# Altium footprint library AUAV_X05.PcbLib: 69 footprints (part 2 of 5)
Each footprint in its own frame and in the unit in brackets; x right, y up, seen from the top. Pads: shape width x height; smd on the part's side, far side on the other; paste and mask are expansions set on the pad; w line width, h text height; cw(c..) or ccw(c..) is an arc to the next point about the centre after c.
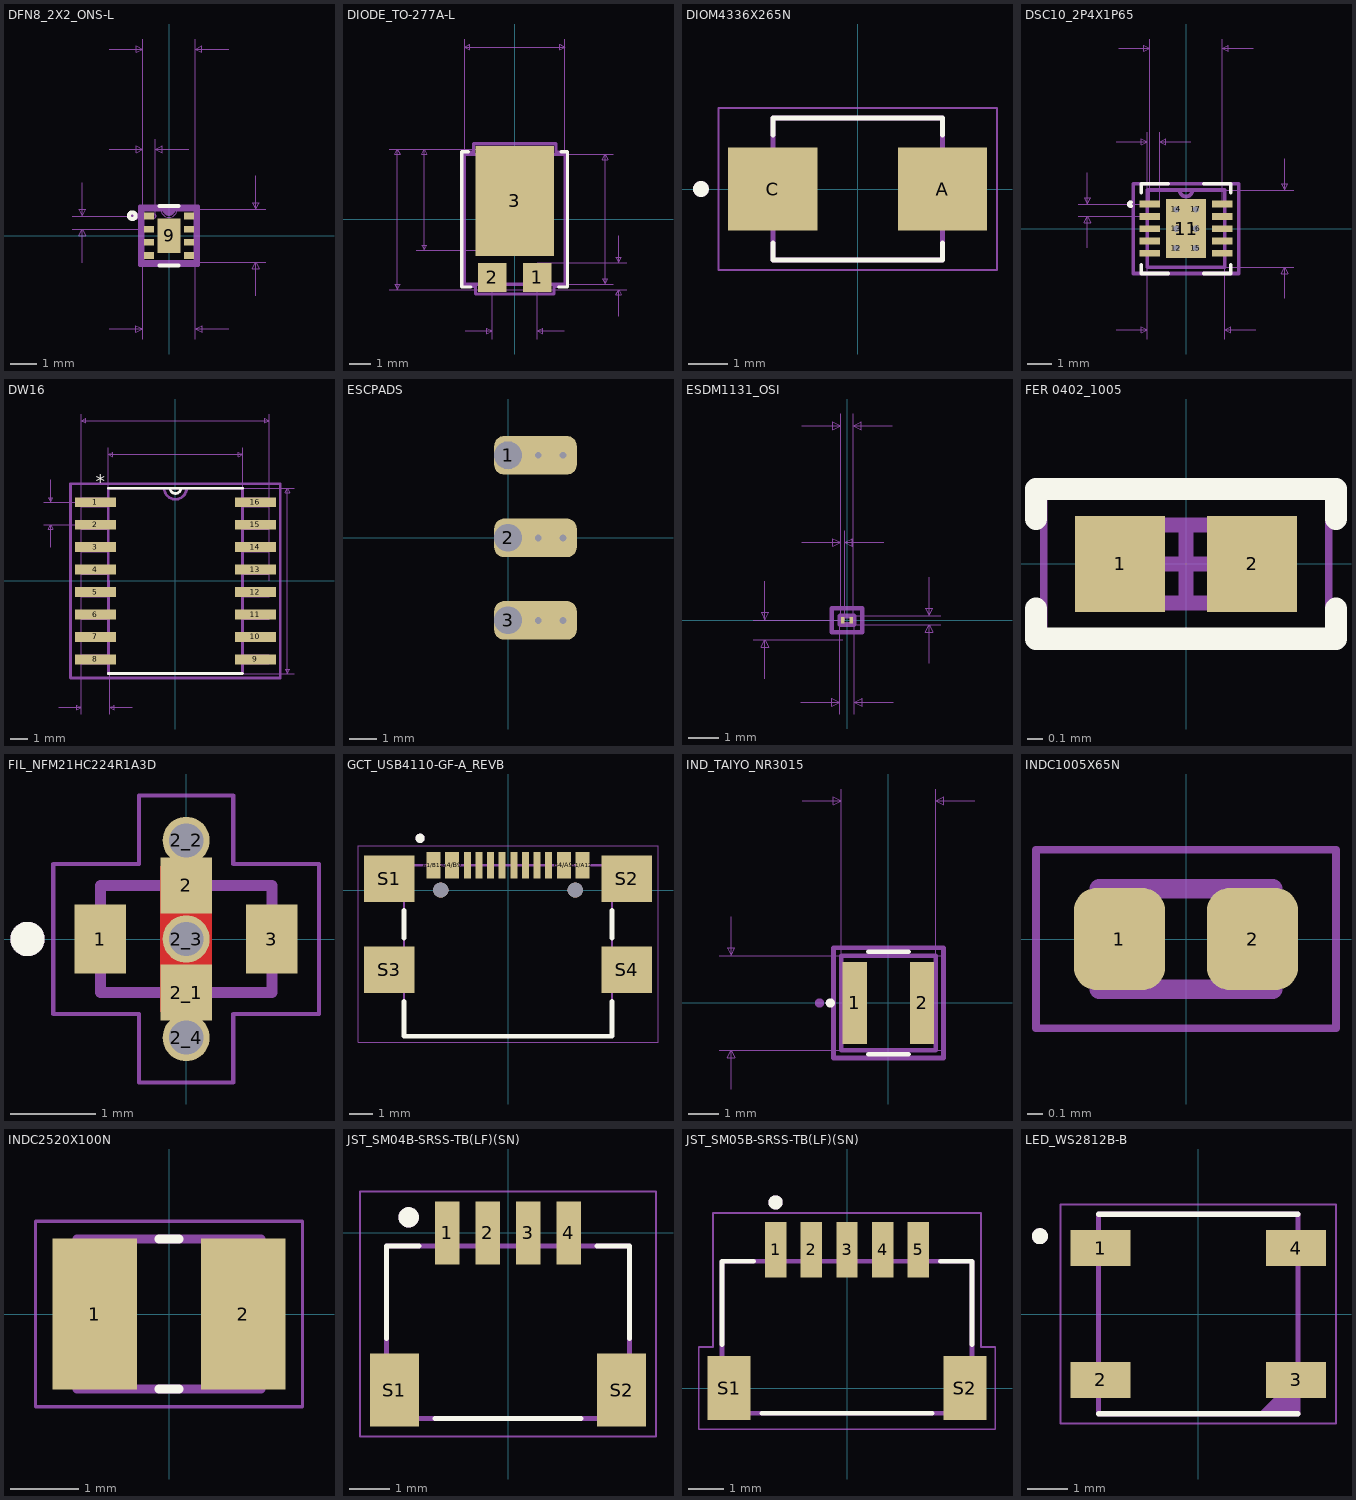
[diagram p1: the footprints below, top view; thin cyan lines are the x and y axes]

## DFN8_2X2_ONS-L [mil]
pads (9):
  rect 15x10 smd: 1(-29.87,29.53) 2(-29.87,9.84) 3(-29.87,-9.84) 4(-29.87,-29.53) 5(29.87,-29.53) 6(29.87,-9.84) 7(29.87,9.84) 8(29.87,29.53)
  rect 34x51 smd: 9(0,0)
Top Overlay:
  circle w6: c-55,30 r5
  lines w6: -13.88,-44.5 13.88,-44.5 ; -13.88,44.5 13.88,44.5
Mechanical 1:
  circle w1: c-22.37,29.53 r3
  lines w1: -12,39.5 ccw(c0,39.5) 12,39.5 ; -39.5,-39.5 39.5,-39.5 39.5,39.5 -39.5,39.5 -39.5,-39.5
Mechanical 16:
  circle w6: c-51.21,29.53 r3
  lines w1: -144.87,9.84 -29.87,9.84 ; -144.87,29.53 -29.87,29.53 ; -129.87,-40.16 -129.87,9.84 ; -129.87,79.53 -129.87,29.53 ; -89.5,-139.5 -39.5,-139.5 ; -89.37,129.53 -39.37,129.53 ; -89.37,279.53 -39.37,279.53 ; -39.5,-154.5 -39.5,-39.5 ; -39.37,144.53 -39.37,29.53 -39.37,294.53 ; -20.37,29.53 -20.37,144.53 ; 29.63,129.53 -20.37,129.53 ; 39.37,29.53 39.37,294.53 ; 39.5,-154.5 39.5,-39.5 144.87,-39.5 ; 39.5,39.5 144.87,39.5 ; 89.37,279.53 39.37,279.53 ; 89.5,-139.5 39.5,-139.5 ; 129.87,-89.5 129.87,-39.5 ; 129.87,89.5 129.87,39.5 ; -129.87,9.84 -134.87,-0.16 -124.87,-0.16 -129.87,9.84 ; -129.87,29.53 -134.87,39.53 -124.87,39.53 -129.87,29.53 ; -39.5,-139.5 -49.5,-134.5 -49.5,-144.5 -39.5,-139.5 ; -39.37,129.53 -49.37,134.53 -49.37,124.53 -39.37,129.53 ; -39.37,279.53 -49.37,284.53 -49.37,274.53 -39.37,279.53 ; -20.37,129.53 -10.37,134.53 -10.37,124.53 -20.37,129.53 ; 39.37,279.53 49.37,284.53 49.37,274.53 39.37,279.53 ; 39.5,-139.5 49.5,-134.5 49.5,-144.5 39.5,-139.5 ; 129.87,-39.5 124.87,-49.5 134.87,-49.5 129.87,-39.5 ; 129.87,39.5 124.87,49.5 134.87,49.5 129.87,39.5
  lines w6: -6.58,39.5 ccw(c0,39.5) 6.58,39.5 ; -43.5,-43.5 -43.5,-38.53 -43.5,38.53 -43.5,43.5 43.5,43.5 43.5,38.53 43.5,-38.53 43.5,-43.5 -43.5,-43.5 ; -39.5,-39.5 -39.5,39.5 39.5,39.5 39.5,-39.5 -39.5,-39.5
  text "Default Padstyle: RX15Y10D0T" at 0,-359.5 h31.25
  text "Heat Tab Padstyle: RX34Y51D0T" at 0,-419.5 h31.25
  text "Alt 1 Padstyle: OX60Y90D30P" at 0,-539.5 h31.25
  text "Alt 2 Padstyle: OX90Y60D30P" at 0,-599.5 h31.25
  text "0.079in/2mm" at 0,299.53 h15.62
  text "0.019in/0.483mm" at -29.87,149.53 h15.62
  text "0.02in/0.5mm" at -149.87,19.68 h15.62
  text "0.079in/2.007mm" at 149.87,0 h15.62
  text "0.079in/2.007mm" at 0,-159.5 h15.62
3D body "DFN8_2X2_ONS.step": height 39.09, standoff 0, extent -39.49,-39.49 39.49,39.49

## DIODE_TO-277A-L [mil]
pads (3):
  rect 53x54 smd: 1(42,-108) 2(-42,-108)
  rect 146x205 smd: 3(0,34.5)
Top Overlay:
  lines w6: -86.1,126 -98.5,126 -98.5,-126 -81.6,-126 ; 81.6,-126 98.5,-126 98.5,126 86.1,126
Mechanical 1:
  lines w1: -93.5,-121 93.5,-121 93.5,121 -93.5,121 -93.5,-121
Mechanical 16:
  lines w1: -233.5,-131 42,-131 208.5,-131 ; -233.5,131 42,131 -183.5,131 ; -183.5,-58 42,-58 ; -93.5,-121 -93.5,336 ; -92,-208 -42,-208 ; -42,-223 -42,-108 ; 42,-223 42,-108 ; 42,-81 208.5,-81 ; 92,-208 42,-208 ; 93.5,121 183.5,121 ; 93.5,336 93.5,-121 183.5,-121 ; 193.5,-181 193.5,-131 ; 193.5,-31 193.5,-81 ; -218.5,-131 -218.5,131 ; -218.5,-131 -223.5,-121 -213.5,-121 -218.5,-131 ; -218.5,131 -223.5,121 -213.5,121 -218.5,131 ; -168.5,-58 -168.5,131 ; -168.5,-58 -173.5,-48 -163.5,-48 -168.5,-58 ; -168.5,131 -173.5,121 -163.5,121 -168.5,131 ; -93.5,321 93.5,321 ; -93.5,321 -83.5,326 -83.5,316 -93.5,321 ; -42,-208 -52,-203 -52,-213 -42,-208 ; 42,-208 52,-203 52,-213 42,-208 ; 93.5,321 83.5,326 83.5,316 93.5,321 ; 168.5,-121 168.5,121 ; 168.5,-121 163.5,-111 173.5,-111 168.5,-121 ; 168.5,121 163.5,111 173.5,111 168.5,121 ; 193.5,-131 188.5,-141 198.5,-141 193.5,-131 ; 193.5,-81 188.5,-71 198.5,-71 193.5,-81
  lines w6: -97.5,-125 -97.5,125 -77,125 -77,141 77,141 77,125 97.5,125 97.5,-125 73,-125 73,-139 -73,-139 -73,-125 -97.5,-125 ; -93.5,-121 -93.5,121 93.5,121 93.5,-121 -93.5,-121
  text "Default Padstyle: RX54Y53D0T" at 0,-431 h31.25
  text "Alt 1 Padstyle: OX60Y90D30P" at 0,-491 h31.25
  text "Alt 2 Padstyle: OX90Y60D30P" at 0,-551 h31.25
  text "0.262in/6.655mm" at -238.5,0 h15.62
  text "0.05in/1.27mm" at 213.5,-106 h15.62
  text "0.084in/2.134mm" at 0,-228 h15.62
  text "0.242in/6.147mm" at 188.5,0 h15.62
  text "0.187in/4.75mm" at 0,341 h15.62
3D body "smpc package.step": height 41.34, standoff 0, extent -91.1,-130 90,125.9

## DIOM4336X265N [mm]
pads (2):
  rect 2.28x2.12 smd: A(2.165,0) C(-2.165,0)
Top Overlay:
  circle w0.2: c-4,0 r0.1
  lines w0.127: -2.163,-1.38 -2.163,-1.813 2.163,-1.813 2.163,-1.38 ; -2.163,1.38 -2.163,1.813 2.163,1.813 2.163,1.38
Top 3D Body:
  circle w0.2: c-4,0 r0.1
  lines w0.127: -2.163,-1.813 -2.163,1.813 2.163,1.813 2.163,-1.813 -2.163,-1.813
Mechanical 15:
  lines w0.05: -3.555,-2.063 -3.555,2.063 3.555,2.063 3.555,-2.063 -3.555,-2.063
3D body "step_temp.STEP": height 2.65, standoff 0, extent -2.675,-1.813 2.675,1.813

## DSC10_2P4X1P65 [mm]
pads (17):
  rect 0.85x0.28 smd: 1(-1.475,1) 2(-1.475,0.5) 3(-1.475,0) 4(-1.475,-0.5) 5(-1.475,-1) 6(1.475,-1) 7(1.475,-0.5) 8(1.475,0) 9(1.475,0.5) 10(1.475,1)
  rect 1.65x2.4 smd: 11(0,0)
  round 0.508 hole 0.254 mask-25.4: 12(-0.394,-0.787) 13(-0.394,0) 14(-0.394,0.787) 15(0.394,-0.787) 16(0.394,0) 17(0.394,0.787)
Top Overlay:
  lines w0.152: -2.233,0.926 cw(c-2.252,1) -2.233,1.074 ; -1.829,-1.473 -1.829,-1.829 -0.723,-1.829 ; -1.829,1.473 -1.829,1.829 -0.723,1.829 ; 0.723,-1.829 1.829,-1.829 1.829,-1.473 ; 0.723,1.829 1.829,1.829 1.829,1.473
Top Solder:
  region: -0.394,-0.528 -0.493,-0.548 -0.577,-0.604 -0.633,-0.688 -0.653,-0.787 -0.633,-0.887 -0.577,-0.971 -0.493,-1.027 -0.394,-1.046 -0.295,-1.027 -0.211,-0.971 -0.154,-0.887 -0.135,-0.787 -0.154,-0.688 -0.211,-0.604 -0.295,-0.548
  region: -0.394,0.259 -0.493,0.239 -0.577,0.183 -0.633,0.099 -0.653,0 -0.633,-0.099 -0.577,-0.183 -0.493,-0.239 -0.394,-0.259 -0.295,-0.239 -0.211,-0.183 -0.154,-0.099 -0.135,0 -0.154,0.099 -0.211,0.183 -0.295,0.239
  region: -0.394,1.046 -0.493,1.027 -0.577,0.971 -0.633,0.887 -0.653,0.787 -0.633,0.688 -0.577,0.604 -0.493,0.548 -0.394,0.528 -0.295,0.548 -0.211,0.604 -0.154,0.688 -0.135,0.787 -0.154,0.887 -0.211,0.971 -0.295,1.027
  region: 0.394,-0.528 0.295,-0.548 0.211,-0.604 0.154,-0.688 0.135,-0.787 0.154,-0.887 0.211,-0.971 0.295,-1.027 0.394,-1.046 0.493,-1.027 0.577,-0.971 0.633,-0.887 0.653,-0.787 0.633,-0.688 0.577,-0.604 0.493,-0.548
  region: 0.394,0.259 0.295,0.239 0.211,0.183 0.154,0.099 0.135,0 0.154,-0.099 0.211,-0.183 0.295,-0.239 0.394,-0.259 0.493,-0.239 0.577,-0.183 0.633,-0.099 0.653,0 0.633,0.099 0.577,0.183 0.493,0.239
  region: 0.394,1.046 0.295,1.027 0.211,0.971 0.154,0.887 0.135,0.787 0.154,0.688 0.211,0.604 0.295,0.548 0.394,0.528 0.493,0.548 0.577,0.604 0.633,0.688 0.653,0.787 0.633,0.887 0.577,0.971 0.493,1.027
Bottom Solder:
  region: -0.394,-0.528 -0.493,-0.548 -0.577,-0.604 -0.633,-0.688 -0.653,-0.787 -0.633,-0.887 -0.577,-0.971 -0.493,-1.027 -0.394,-1.046 -0.295,-1.027 -0.211,-0.971 -0.154,-0.887 -0.135,-0.787 -0.154,-0.688 -0.211,-0.604 -0.295,-0.548
  region: -0.394,0.259 -0.493,0.239 -0.577,0.183 -0.633,0.099 -0.653,0 -0.633,-0.099 -0.577,-0.183 -0.493,-0.239 -0.394,-0.259 -0.295,-0.239 -0.211,-0.183 -0.154,-0.099 -0.135,0 -0.154,0.099 -0.211,0.183 -0.295,0.239
  region: -0.394,1.046 -0.493,1.027 -0.577,0.971 -0.633,0.887 -0.653,0.787 -0.633,0.688 -0.577,0.604 -0.493,0.548 -0.394,0.528 -0.295,0.548 -0.211,0.604 -0.154,0.688 -0.135,0.787 -0.154,0.887 -0.211,0.971 -0.295,1.027
  region: 0.394,-0.528 0.295,-0.548 0.211,-0.604 0.154,-0.688 0.135,-0.787 0.154,-0.887 0.211,-0.971 0.295,-1.027 0.394,-1.046 0.493,-1.027 0.577,-0.971 0.633,-0.887 0.653,-0.787 0.633,-0.688 0.577,-0.604 0.493,-0.548
  region: 0.394,0.259 0.295,0.239 0.211,0.183 0.154,0.099 0.135,0 0.154,-0.099 0.211,-0.183 0.295,-0.239 0.394,-0.259 0.493,-0.239 0.577,-0.183 0.633,-0.099 0.653,0 0.633,0.099 0.577,0.183 0.493,0.239
  region: 0.394,1.046 0.295,1.027 0.211,0.971 0.154,0.887 0.135,0.787 0.154,0.688 0.211,0.604 0.295,0.548 0.394,0.528 0.493,0.548 0.577,0.604 0.633,0.688 0.653,0.787 0.633,0.887 0.577,0.971 0.493,1.027
Mechanical 1:
  circle w0.025: c-2.252,1 r0.076
  lines w0.025: -0.305,1.575 ccw(c0,1.575) 0.305,1.575 ; -1.575,-1.575 1.575,-1.575 1.575,1.575 -1.575,1.575 -1.575,-1.575
Mechanical 16:
  circle w0.152: c-2.252,1 r0.076
  lines w0.025: -4.396,0.5 -1.475,0.5 ; -4.396,1 -1.475,1 -1.475,7.731 ; -4.015,-0.77 -4.015,0.5 ; -4.015,2.27 -4.015,1 ; -2.845,-4.115 -1.575,-4.115 ; -2.845,3.54 -1.575,3.54 ; -2.745,7.35 -1.475,7.35 ; -1.575,-4.496 -1.575,-1.575 ; -1.575,1 -1.575,3.921 ; -1.075,1 -1.075,3.921 ; 0.195,3.54 -1.075,3.54 ; 1.475,1 1.475,7.731 ; 1.575,-4.496 1.575,-1.575 4.396,-1.575 ; 1.575,1.575 4.396,1.575 ; 2.745,7.35 1.475,7.35 ; 2.845,-4.115 1.575,-4.115 ; 4.015,-2.845 4.015,-1.575 ; 4.015,2.845 4.015,1.575 ; -4.015,0.5 -4.142,0.246 -3.888,0.246 -4.015,0.5 ; -4.015,1 -4.142,1.254 -3.888,1.254 -4.015,1 ; -1.575,-4.115 -1.829,-3.988 -1.829,-4.242 -1.575,-4.115 ; -1.575,3.54 -1.829,3.667 -1.829,3.413 -1.575,3.54 ; -1.475,7.35 -1.729,7.477 -1.729,7.223 -1.475,7.35 ; -1.075,3.54 -0.821,3.667 -0.821,3.413 -1.075,3.54 ; 1.475,7.35 1.729,7.477 1.729,7.223 1.475,7.35 ; 1.575,-4.115 1.829,-3.988 1.829,-4.242 1.575,-4.115 ; 4.015,-1.575 3.888,-1.829 4.142,-1.829 4.015,-1.575 ; 4.015,1.575 3.888,1.829 4.142,1.829 4.015,1.575
  lines w0.152: -0.262,1.575 ccw(c0,1.575) 0.262,1.575 ; -2.154,-1.829 -2.154,1.829 2.154,1.829 2.154,-1.829 -2.154,-1.829 ; -1.575,-1.575 -1.575,1.575 1.575,1.575 1.575,-1.575 -1.575,-1.575
  text "Default Padstyle: RX33p46Y11p02D0T" at 0,-9.83 h0.79
  text "Alt 1 Padstyle: OX60Y90D30P" at 0,-11.735 h0.79
  text "Alt 2 Padstyle: OX90Y60D30P" at 0,-13.64 h0.79
  text ".1161417in/2.95mm" at 0,7.858 h0.4
  text "1.968504E-02in/.5mm" at -1.325,4.048 h0.4
  text "1.968504E-02in/.5mm" at -4.523,0.75 h0.4
  text ".1240157in/3.15mm" at 4.523,0 h0.4
  text ".1240157in/3.15mm" at 0,-4.623 h0.4
3D body "DSC0010J.stp": height 0.8, standoff 0, extent -1.5,-1.5 1.5,1.5

## DW16 [mil]
pads (16):
  rect 91x22 smd: 1(-178,175) 2(-178,125) 3(-178,75) 4(-178,25) 5(-178,-25) 6(-178,-75) 7(-178,-125) 8(-178,-175) 9(178,-175) 10(178,-125) 11(178,-75) 12(178,-25) 13(178,25) 14(178,75) 15(178,125) 16(178,175)
Top Overlay:
  lines w6: -149.5,-206.5 149.5,-206.5 ; -149.5,206.5 149.5,206.5 ; -12,206.5 ccw(c0,206.5) 12,206.5
  text "*" at -177,204.61 h31.25
Mechanical 1:
  lines w1: -12,206.5 ccw(c0,206.5) 12,206.5 ; -209.5,-185 -209.5,-165 -149.5,-165 -149.5,-185 -209.5,-185 ; -209.5,-135 -209.5,-115 -149.5,-115 -149.5,-135 -209.5,-135 ; -209.5,-85 -209.5,-65 -149.5,-65 -149.5,-85 -209.5,-85 ; -209.5,-35 -209.5,-15 -149.5,-15 -149.5,-35 -209.5,-35 ; -209.5,15 -209.5,35 -149.5,35 -149.5,15 -209.5,15 ; -209.5,65 -209.5,85 -149.5,85 -149.5,65 -209.5,65 ; -209.5,115 -209.5,135 -149.5,135 -149.5,115 -209.5,115 ; -209.5,165 -209.5,185 -149.5,185 -149.5,165 -209.5,165 ; -149.5,-206.5 149.5,-206.5 149.5,206.5 -149.5,206.5 -149.5,-206.5 ; 149.5,-185 149.5,-165 209.5,-165 209.5,-185 149.5,-185 ; 149.5,-135 149.5,-115 209.5,-115 209.5,-135 149.5,-135 ; 149.5,-85 149.5,-65 209.5,-65 209.5,-85 149.5,-85 ; 149.5,-35 149.5,-15 209.5,-15 209.5,-35 149.5,-35 ; 149.5,15 149.5,35 209.5,35 209.5,15 149.5,15 ; 149.5,65 149.5,85 209.5,85 209.5,65 149.5,65 ; 149.5,115 149.5,135 209.5,135 209.5,115 149.5,115 ; 149.5,165 149.5,185 209.5,185 209.5,165 149.5,165
  text "*" at -177,204.61 h31.25
Mechanical 16:
  lines w1: -293,125 -178,125 ; -293,175 -178,175 ; -278,75 -278,125 ; -278,225 -278,175 ; -259.5,-281.5 -209.5,-281.5 ; -209.5,-296.5 -209.5,0 -209.5,371.5 ; -149.5,0 -149.5,296.5 ; -146.5,-296.5 -146.5,0 ; -96.5,-281.5 -146.5,-281.5 ; 0,-206.5 264.5,-206.5 ; 0,206.5 264.5,206.5 ; 149.5,0 149.5,296.5 ; 209.5,0 209.5,371.5 ; -278,125 -283,115 -273,115 -278,125 ; -278,175 -283,185 -273,185 -278,175 ; -209.5,-281.5 -219.5,-276.5 -219.5,-286.5 -209.5,-281.5 ; -209.5,356.5 209.5,356.5 ; -209.5,356.5 -199.5,361.5 -199.5,351.5 -209.5,356.5 ; -149.5,281.5 149.5,281.5 ; -149.5,281.5 -139.5,286.5 -139.5,276.5 -149.5,281.5 ; -146.5,-281.5 -136.5,-276.5 -136.5,-286.5 -146.5,-281.5 ; 149.5,281.5 139.5,286.5 139.5,276.5 149.5,281.5 ; 209.5,356.5 199.5,361.5 199.5,351.5 209.5,356.5 ; 249.5,-206.5 249.5,206.5 ; 249.5,-206.5 244.5,-196.5 254.5,-196.5 249.5,-206.5 ; 249.5,206.5 244.5,196.5 254.5,196.5 249.5,206.5
  lines w6: -24.92,206.5 ccw(c0,206.5) 24.92,206.5 ; -233.5,-216.5 -233.5,216.5 233.5,216.5 233.5,-216.5 -233.5,-216.5 ; -149.5,-206.5 -149.5,206.5 149.5,206.5 149.5,-206.5 -149.5,-206.5
  text "Default Padstyle: RX91Y22D0T" at 0,-356.5 h31.25
  text "Pin One Padstyle: RX91Y22D0T" at 0,-431.5 h31.25
  text "Alt 1 Padstyle: OX60Y90D30P" at 0,-506.5 h31.25
  text "Alt 2 Padstyle: OX90Y60D30P" at 0,-581.5 h31.25
  text ".299in/7.595mm" at 0,301.5 h15.62
  text ".419in/10.643mm" at 0,376.5 h15.62
  text ".413in/10.49mm" at 269.5,0 h15.62
  text ".05in/1.27mm" at -298,150 h15.62
  text ".05in/1.27mm" at -178,-301.5 h15.62
3D body "DW0016A.stp": height 101.81, standoff 0, extent -203.44,-202.75 203.45,202.76

## ESCPADS [mm]
pads (3):
  rrect50% 3x1.4 hole 1 copper offset 1,0: 1(0,3) 2(0,0) 3(0,-3)
via 1.1,0 diameter 0.5 hole 0.25
via 2,0 diameter 0.5 hole 0.25
via 1.1,3 diameter 0.5 hole 0.25
via 2,3 diameter 0.5 hole 0.25
via 1.1,-3 diameter 0.5 hole 0.25
via 2,-3 diameter 0.5 hole 0.25

## ESDM1131_OSI [mil]
pads (2):
  rect 5x8 smd: 1(-5.5,0) 2(5.5,0)
Mechanical 1:
  lines w1: -9.5,-5.5 9.5,-5.5 9.5,5.5 -9.5,5.5 -9.5,-5.5
Mechanical 16:
  lines w1: -120.5,-25 -5.5,-25 ; -120.5,0 -5.5,0 ; -105.5,-75 -105.5,-25 ; -105.5,50 -105.5,0 ; -59.5,-105.5 -9.5,-105.5 ; -58,100 -8,100 ; -58,250 -8,250 ; -9.5,-120.5 -9.5,-5.5 ; -8,115 -8,0 -8,265 ; -3,0 -3,115 ; 8,0 8,265 ; 9.5,-120.5 9.5,-5.5 120.5,-5.5 ; 9.5,5.5 120.5,5.5 ; 47,100 -3,100 ; 58,250 8,250 ; 59.5,-105.5 9.5,-105.5 ; 105.5,-55.5 105.5,-5.5 ; 105.5,55.5 105.5,5.5 ; -105.5,-25 -110.5,-35 -100.5,-35 -105.5,-25 ; -105.5,0 -110.5,10 -100.5,10 -105.5,0 ; -9.5,-105.5 -19.5,-100.5 -19.5,-110.5 -9.5,-105.5 ; -8,100 -18,105 -18,95 -8,100 ; -8,250 -18,255 -18,245 -8,250 ; -3,100 7,105 7,95 -3,100 ; 8,250 18,255 18,245 8,250 ; 9.5,-105.5 19.5,-100.5 19.5,-110.5 9.5,-105.5 ; 105.5,-5.5 100.5,-15.5 110.5,-15.5 105.5,-5.5 ; 105.5,5.5 100.5,15.5 110.5,15.5 105.5,5.5
  lines w6: -19.5,-15.5 -19.5,-14 -19.5,14 -19.5,15.5 19.5,15.5 19.5,14 19.5,-14 19.5,-15.5 -19.5,-15.5 ; -9.5,-5.5 -9.5,5.5 9.5,5.5 9.5,-5.5 -9.5,-5.5
  text "Default Padstyle: RX5Y8D0T" at 0,-325.5 h31.25
  text "Alt 1 Padstyle: OX60Y90D30P" at 0,-505.5 h31.25
  text "Alt 2 Padstyle: OX90Y60D30P" at 0,-565.5 h31.25
  text "0.016in/0.406mm" at 0,270 h15.62
  text "0.005in/0.127mm" at -5.5,120 h15.62
  text "0.025in/0.635mm" at -125.5,-12.5 h15.62
  text "0.011in/0.279mm" at 125.5,0 h15.62
  text "0.019in/0.483mm" at 0,-125.5 h15.62
3D body "ESDM1131_OSI.step": height 7.72, standoff -0.39, extent -9.48,-5.51 9.49,5.51

## FER 0402_1005 [mm]
pads (2):
  rect 0.6x0.64 smd: 1(-0.44,0) 2(0.44,0)
Top Overlay:
  lines w0.15: -1,-0.3 -1,-0.5 1,-0.5 1,-0.3 ; -1,0.3 -1,0.5 1,0.5 1,0.3
Top 3D Body:
  lines w0.1: -0.515,-0.26 0.515,-0.26 0.515,0.26 -0.515,0.26 -0.515,-0.26
Mechanical 15:
  lines w0.05: -0.95,-0.5 0.95,-0.5 0.95,0.5 -0.95,0.5 -0.95,-0.5
  lines w0.1: -0.26,0 0.26,0 ; 0,-0.26 0,0.26
3D body "FER 0402.STEP": height 0.52, standoff 0, extent -0.5,-0.262 0.5,0.262

## FIL_NFM21HC224R1A3D [mm]
pads (7):
  rect 0.6x0.8 smd mask+0: 1(-1,0) 3(1,0)
  rect 0.6x0.65 smd mask+0: 2(0,0.625) 2_1(0,-0.625)
  round 0.55 hole 0.4 mask+0: 2_2(0,1.15) 2_3(0,0) 2_4(0,-1.15)
Top Layer:
  region: 0.3,-0.85 -0.3,-0.85 -0.3,0.85 0.3,0.85
Top Overlay:
  circle w0.2: c-1.85,0 r0.1
Top Solder:
  region: -0.7,-0.4 -1.3,-0.4 -1.3,0.4 -0.7,0.4
  region: 1.3,-0.4 0.7,-0.4 0.7,0.4 1.3,0.4
  region: 0.3,-0.95 -0.3,-0.95 -0.3,-0.3 0.3,-0.3
  region: 0.3,0.3 -0.3,0.3 -0.3,0.95 0.3,0.95
Top 3D Body:
  circle w0.2: c-1.85,0 r0.1
  lines w0.127: -1,-0.625 -1,0.625 1,0.625 1,-0.625 -1,-0.625
Mechanical 15:
  lines w0.05: -1.55,-0.875 -0.55,-0.875 -0.55,-1.675 0.55,-1.675 0.55,-0.875 1.55,-0.875 1.55,0.875 0.55,0.875 0.55,1.675 -0.55,1.675 -0.55,0.875 -1.55,0.875 -1.55,-0.875
3D body "NFM21HC224R1A3D.STEP": height 0.95, standoff 0, extent -1,-0.625 1,0.625

## GCT_USB4110-GF-A_REVB [mm]
pads (18):
  rect 0.6x1.15 smd: A1/B12(-3.2,1.075) A4/B9(-2.4,1.075) B1/A12(3.2,1.075) B4/A9(2.4,1.075)
  rect 0.3x1.15 smd: A5(-1.25,1.075) A6(-0.25,1.075) A7(0.25,1.075) A8(1.25,1.075) B5(1.75,1.075) B6(0.75,1.075) B7(-0.75,1.075) B8(-1.75,1.075)
  rect 2.18x2 smd: S1(-5.11,0.5) S2(5.11,0.5) S3(-5.11,-3.43) S4(5.11,-3.43)
  round 0.65 hole 0.65 unplated: ""(-2.89,0) ""(2.89,0)
Top Overlay:
  circle w0.2: c-3.78,2.23 r0.1
  lines w0.2: -4.47,-4.79 -4.47,-6.28 4.47,-6.28 4.47,-4.79 ; -4.47,-2.07 -4.47,-0.86 ; 4.47,-2.07 4.47,-0.86
Top 3D Body:
  circle w0.2: c-3.78,2.23 r0.1
  lines w0.1: -4.47,-6.28 -4.47,1.07 4.47,1.07 4.47,-6.28 -4.47,-6.28
Mechanical 15:
  lines w0.05: -6.45,-6.53 6.45,-6.53 6.45,1.9 -6.45,1.9 -6.45,-6.53
3D body "step_temp.STEP": height 3.26, standoff -0.7, extent -5.65,-6.274 5.65,1.406

## IND_TAIYO_NR3015 [mil]
pads (2):
  rect 31.5x106 smd: 1(-43.25,0) 2(43.25,0)
Top Overlay:
  circle w6: c-75,0 r3
  lines w6: -25.88,-66 25.88,-66 ; -25.88,66 25.88,66
Mechanical 1:
  circle w1: c-58,0 r3
  lines w1: -61,-61 -61,61 61,61 61,-61 -61,-61
Mechanical 16:
  circle w6: c-89,0 r3
  lines w1: -218,-61 71,-61 ; -218,61 71,61 ; -203,-111 -203,-61 ; -203,111 -203,61 ; -111,261 -61,261 ; -61,63 -61,276 ; 61,63 61,276 ; 111,261 61,261 ; -203,-61 -198,-71 -208,-71 -203,-61 ; -203,61 -198,71 -208,71 -203,61 ; -61,261 -71,256 -71,266 -61,261 ; 61,261 71,256 71,266 61,261
  lines w6: -71,-71 71,-71 71,-63 71,63 71,71 -71,71 -71,63 -71,-63 -71,-71 ; -61,-61 -61,61 61,61 61,-61 -61,-61
  text "0.122in/3.099mm" at -223,0 h15.62
  text "0.122in/3.099mm" at 0,281 h15.62
  text "Alt 2 Pad Style: EX90Y60D30P" at 0,-321 h31.25
  text "Alt 1 Pad Style: OX60Y90D30P" at 0,-271 h31.25
  text "Default Pad Style: RX31p5Y106D0T" at 0,-221 h31.25
3D body "IND_TAIYO_NR3015_TAY.step": height 59.02, standoff 0, extent -60.98,-61.1 60.99,61.1

## INDC1005X65N [mm]
pads (2):
  rrect50% 0.6x0.67 smd: 1(-0.437,0) 2(0.437,0)
Top 3D Body:
  lines w0.127: -0.57,-0.33 -0.57,0.33 0.57,0.33 0.57,-0.33 -0.57,-0.33
Mechanical 15:
  lines w0.05: -0.985,-0.585 -0.985,0.585 0.985,0.585 0.985,-0.585 -0.985,-0.585
3D body "AIMC-0402-39NJ-T.STEP": height 0.49, standoff -0.01, extent -0.5,-0.25 0.5,0.25

## INDC2520X100N [mm]
pads (2):
  rect 1.24x2.22 smd: 1(-1.09,0) 2(1.09,0)
Top Overlay:
  lines w0.127: -0.15,-1.1 0.15,-1.1 ; -0.15,1.1 0.15,1.1
Top 3D Body:
  lines w0.127: -1.35,-1.1 1.35,-1.1 1.35,1.1 -1.35,1.1 -1.35,-1.1
Mechanical 15:
  lines w0.05: -1.958,-1.358 1.958,-1.358 1.958,1.358 -1.958,1.358 -1.958,-1.358
3D body "LQM2HPN1R5MG0L.STEP": height 1, standoff 0, extent -1.25,-1 1.25,1

## JST_SM04B-SRSS-TB(LF)(SN) [mm]
pads (6):
  rect 0.6x1.55 smd: 1(-1.5,0) 2(-0.5,0) 3(0.5,0) 4(1.5,0)
  rect 1.2x1.8 smd: S1(-2.8,-3.875) S2(2.8,-3.875)
Top Overlay:
  circle w0.3: c-2.45,0.385 r0.1
  lines w0.127: -3,-2.6 -3,-0.325 -2.2,-0.325 ; -1.8,-4.575 1.8,-4.575 ; 2.2,-0.325 3,-0.325 3,-2.6
Top 3D Body:
  circle w0.3: c-2.45,0.385 r0.1
  lines w0.127: -3,-4.575 -3,-0.325 3,-0.325 3,-4.575 -3,-4.575
Mechanical 15:
  lines w0.05: -3.65,-5.025 -3.65,1.025 3.65,1.025 3.65,-5.025 -3.65,-5.025
3D body "SM04B-SRSS-TB(LF)(SN)--3DModel-STEP-56544.STEP": height 2.94, standoff -0.02, extent -2.975,-4.595 3.025,0.355

## JST_SM05B-SRSS-TB(LF)(SN) [mm]
pads (7):
  rect 0.6x1.55 smd: 1(-2,3.875) 2(-1,3.875) 3(0,3.875) 4(1,3.875) 5(2,3.875)
  rect 1.2x1.8 smd: S1(-3.3,0) S2(3.3,0)
Top Overlay:
  circle w0.2: c-2,5.2 r0.1
  lines w0.127: -3.5,1.21 -3.5,3.55 -2.61,3.55 ; -2.39,-0.7 2.39,-0.7 ; 2.61,3.55 3.5,3.55 3.5,1.21
Top 3D Body:
  circle w0.2: c-2,5.2 r0.1
  lines w0.127: -3.5,-0.7 3.5,-0.7 3.5,3.55 -3.5,3.55 -3.5,-0.7
Mechanical 15:
  lines w0.05: -4.15,-1.15 4.15,-1.15 4.15,1.15 3.75,1.15 3.75,4.9 -3.75,4.9 -3.75,1.15 -4.15,1.15 -4.15,-1.15
3D body "step_temp.STEP": height 2.95, standoff 0, extent -3.5,-0.75 3.5,4.2

## LED_WS2812B-B [mm]
pads (4):
  rect 1.5x0.9 smd: 1(-2.45,1.65) 2(-2.45,-1.65) 3(2.45,-1.65) 4(2.45,1.65)
Top Overlay:
  circle w0.2: c-3.97,1.95 r0.1
  lines w0.127: -2.5,-2.5 2.5,-2.5 ; -2.5,2.5 2.5,2.5
Top 3D Body:
  circle w0.2: c-3.97,1.95 r0.1
  region: 2.5,-2.5 1.5,-2.5 2.5,-1.5
  lines w0.127: -2.5,-2.5 2.5,-2.5 2.5,2.5 -2.5,2.5 -2.5,-2.5
Mechanical 15:
  lines w0.05: -3.45,-2.75 -3.45,2.75 3.45,2.75 3.45,-2.75 -3.45,-2.75
3D body "WS2812B-B--3DModel-STEP-56544.STEP": height 1.62, standoff 0, extent -2.7,-2.5 2.7,2.5